# Altium footprint library Package_DIP.PcbLib: 236 footprints (part 13 of 15)
Each footprint in its own frame and in the unit in brackets; x right, y up, seen from the top. Pads: shape width x height; smd on the part's side, far side on the other; paste and mask are expansions set on the pad; w line width, h text height; cw(c..) or ccw(c..) is an arc to the next point about the centre after c.
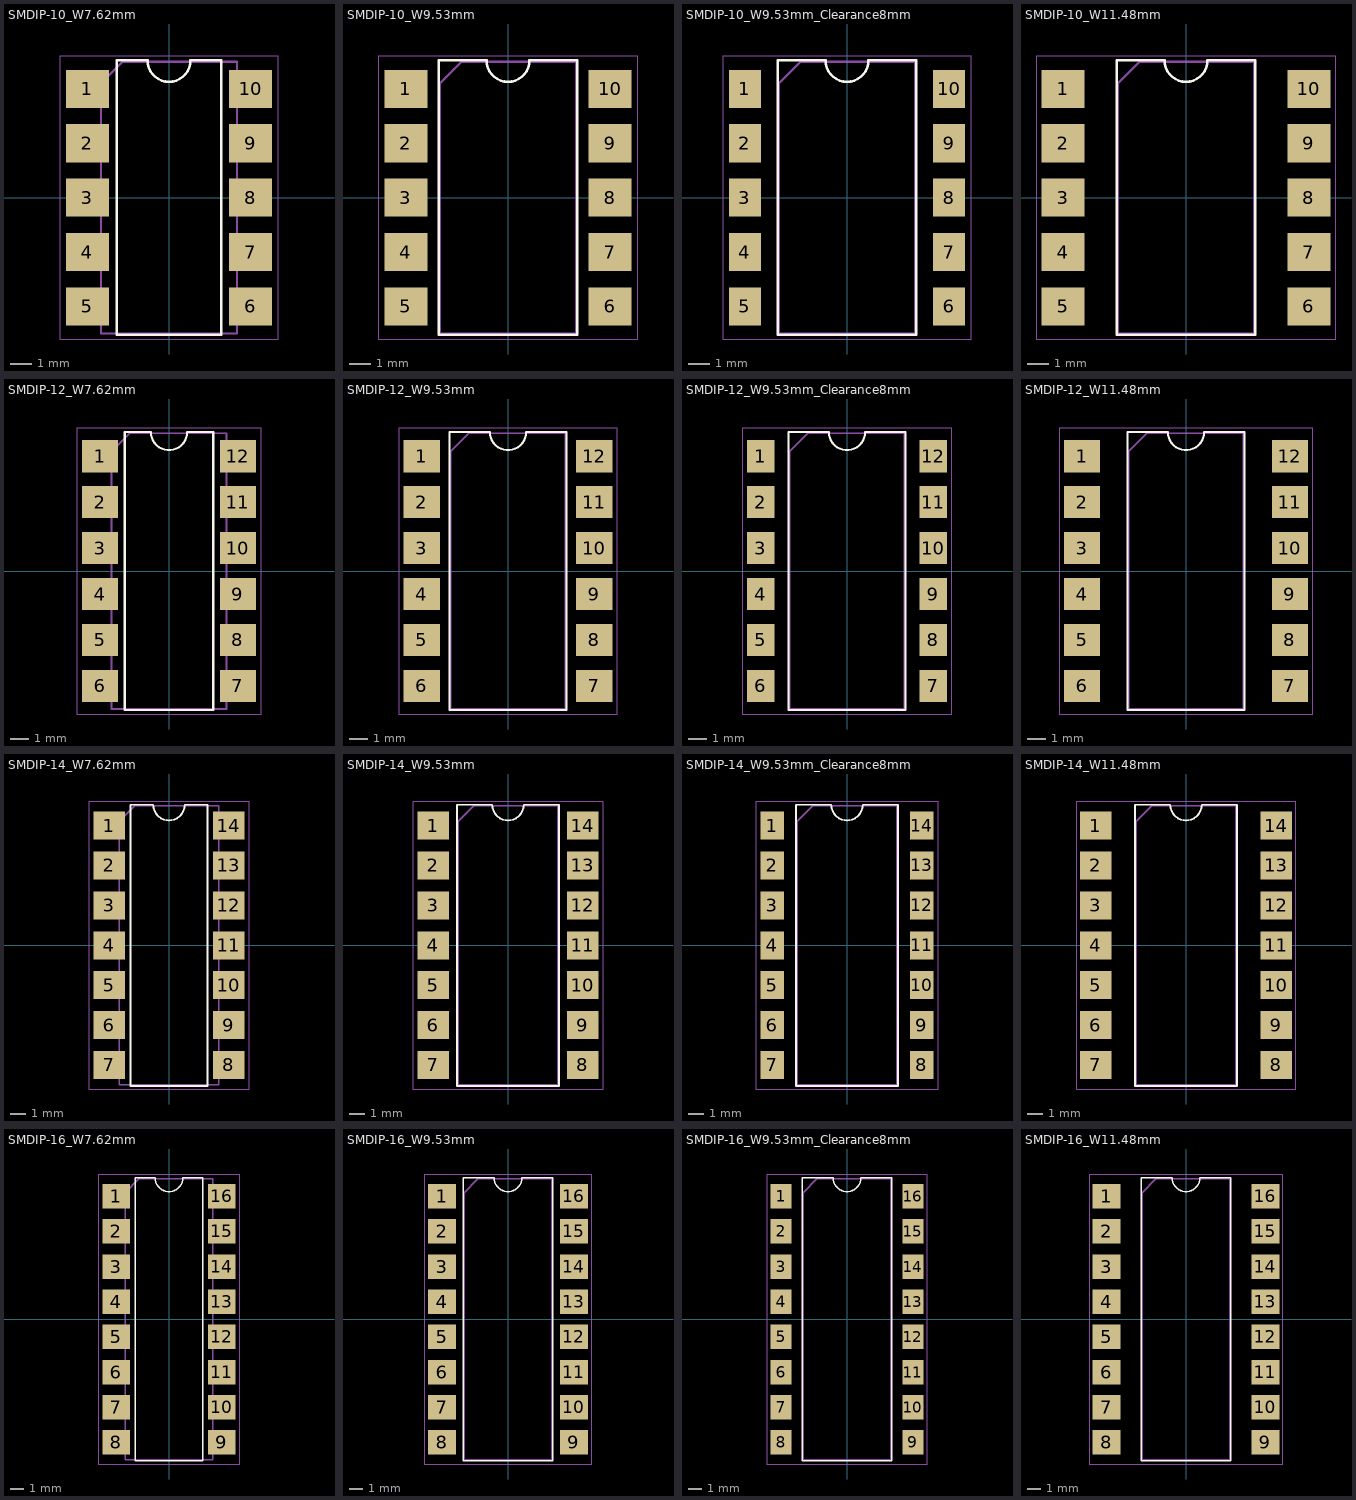
[diagram p12: the footprints below, top view; thin cyan lines are the x and y axes]

## SMDIP-10_W7.62mm [mm]
pads (10):
  rect 2x1.78 smd: 1(-3.81,5.08) 2(-3.81,2.54) 3(-3.81,0) 4(-3.81,-2.54) 5(-3.81,-5.08) 6(3.81,-5.08) 7(3.81,-2.54) 8(3.81,0) 9(3.81,2.54) 10(3.81,5.08)
F.SilkS:
  lines w0.12: -2.45,-6.41 -2.45,6.41 -1,6.41 ccw(c0,6.41) 1,6.41 2.45,6.41 2.45,-6.41 -2.45,-6.41
F.CrtYd:
  lines w0.05: -5.1,-6.6 5.1,-6.6 5.1,6.6 -5.1,6.6 -5.1,-6.6
F.Fab:
  lines w0.1: -3.175,-6.35 -3.175,5.35 -2.175,6.35 3.175,6.35 3.175,-6.35 -3.175,-6.35
  text "'.Designator'" at -4.047,-0.84 h1

## SMDIP-10_W9.53mm [mm]
pads (10):
  rect 2x1.78 smd: 1(-4.765,5.08) 2(-4.765,2.54) 3(-4.765,0) 4(-4.765,-2.54) 5(-4.765,-5.08) 6(4.765,-5.08) 7(4.765,-2.54) 8(4.765,0) 9(4.765,2.54) 10(4.765,5.08)
F.SilkS:
  lines w0.12: -3.235,-6.41 3.235,-6.41 3.235,6.41 1,6.41 cw(c0,6.41) -1,6.41 -3.235,6.41 -3.235,-6.41
F.CrtYd:
  lines w0.05: -6.05,-6.6 -6.05,6.6 6.05,6.6 6.05,-6.6 -6.05,-6.6
F.Fab:
  lines w0.1: -3.175,-6.35 -3.175,5.35 -2.175,6.35 3.175,6.35 3.175,-6.35 -3.175,-6.35
  text "'.Designator'" at -4.047,-0.84 h1

## SMDIP-10_W9.53mm_Clearance8mm [mm]
pads (10):
  rect 1.5x1.78 smd: 1(-4.765,5.08) 2(-4.765,2.54) 3(-4.765,0) 4(-4.765,-2.54) 5(-4.765,-5.08) 6(4.765,-5.08) 7(4.765,-2.54) 8(4.765,0) 9(4.765,2.54) 10(4.765,5.08)
F.SilkS:
  lines w0.12: -3.235,-6.41 3.235,-6.41 3.235,6.41 1,6.41 cw(c0,6.41) -1,6.41 -3.235,6.41 -3.235,-6.41
F.CrtYd:
  lines w0.05: -5.8,-6.6 -5.8,6.6 5.8,6.6 5.8,-6.6 -5.8,-6.6
F.Fab:
  lines w0.1: -3.175,-6.35 -3.175,5.35 -2.175,6.35 3.175,6.35 3.175,-6.35 -3.175,-6.35
  text "'.Designator'" at -4.047,-0.84 h1

## SMDIP-10_W11.48mm [mm]
pads (10):
  rect 2x1.78 smd: 1(-5.74,5.08) 2(-5.74,2.54) 3(-5.74,0) 4(-5.74,-2.54) 5(-5.74,-5.08) 6(5.74,-5.08) 7(5.74,-2.54) 8(5.74,0) 9(5.74,2.54) 10(5.74,5.08)
F.SilkS:
  lines w0.12: -3.235,-6.41 -3.235,6.41 -1,6.41 ccw(c0,6.41) 1,6.41 3.235,6.41 3.235,-6.41 -3.235,-6.41
F.CrtYd:
  lines w0.05: -7,-6.6 7,-6.6 7,6.6 -7,6.6 -7,-6.6
F.Fab:
  lines w0.1: -3.175,-6.35 -3.175,5.35 -2.175,6.35 3.175,6.35 3.175,-6.35 -3.175,-6.35
  text "'.Designator'" at -4.047,-0.84 h1

## SMDIP-12_W7.62mm [mm]
pads (12):
  rect 2x1.78 smd: 1(-3.81,6.35) 2(-3.81,3.81) 3(-3.81,1.27) 4(-3.81,-1.27) 5(-3.81,-3.81) 6(-3.81,-6.35) 7(3.81,-6.35) 8(3.81,-3.81) 9(3.81,-1.27) 10(3.81,1.27) 11(3.81,3.81) 12(3.81,6.35)
F.SilkS:
  lines w0.12: -2.45,-7.68 -2.45,7.68 -1,7.68 ccw(c0,7.68) 1,7.68 2.45,7.68 2.45,-7.68 -2.45,-7.68
F.CrtYd:
  lines w0.05: -5.1,-7.9 5.1,-7.9 5.1,7.9 -5.1,7.9 -5.1,-7.9
F.Fab:
  lines w0.1: -3.175,-7.62 3.175,-7.62 3.175,7.62 -2.175,7.62 -3.175,6.62 -3.175,-7.62
  text "'.Designator'" at -4.047,-0.84 h1

## SMDIP-12_W9.53mm [mm]
pads (12):
  rect 2x1.78 smd: 1(-4.765,6.35) 2(-4.765,3.81) 3(-4.765,1.27) 4(-4.765,-1.27) 5(-4.765,-3.81) 6(-4.765,-6.35) 7(4.765,-6.35) 8(4.765,-3.81) 9(4.765,-1.27) 10(4.765,1.27) 11(4.765,3.81) 12(4.765,6.35)
F.SilkS:
  lines w0.12: -3.235,-7.68 3.235,-7.68 3.235,7.68 1,7.68 cw(c0,7.68) -1,7.68 -3.235,7.68 -3.235,-7.68
F.CrtYd:
  lines w0.05: -6.05,-7.9 6.05,-7.9 6.05,7.9 -6.05,7.9 -6.05,-7.9
F.Fab:
  lines w0.1: -3.175,-7.62 -3.175,6.62 -2.175,7.62 3.175,7.62 3.175,-7.62 -3.175,-7.62
  text "'.Designator'" at -4.047,-0.84 h1

## SMDIP-12_W9.53mm_Clearance8mm [mm]
pads (12):
  rect 1.5x1.78 smd: 1(-4.765,6.35) 2(-4.765,3.81) 3(-4.765,1.27) 4(-4.765,-1.27) 5(-4.765,-3.81) 6(-4.765,-6.35) 7(4.765,-6.35) 8(4.765,-3.81) 9(4.765,-1.27) 10(4.765,1.27) 11(4.765,3.81) 12(4.765,6.35)
F.SilkS:
  lines w0.12: -3.235,-7.68 3.235,-7.68 3.235,7.68 1,7.68 cw(c0,7.68) -1,7.68 -3.235,7.68 -3.235,-7.68
F.CrtYd:
  lines w0.05: -5.8,-7.9 -5.8,7.9 5.8,7.9 5.8,-7.9 -5.8,-7.9
F.Fab:
  lines w0.1: -3.175,-7.62 -3.175,6.62 -2.175,7.62 3.175,7.62 3.175,-7.62 -3.175,-7.62
  text "'.Designator'" at -4.047,-0.84 h1

## SMDIP-12_W11.48mm [mm]
pads (12):
  rect 2x1.78 smd: 1(-5.74,6.35) 2(-5.74,3.81) 3(-5.74,1.27) 4(-5.74,-1.27) 5(-5.74,-3.81) 6(-5.74,-6.35) 7(5.74,-6.35) 8(5.74,-3.81) 9(5.74,-1.27) 10(5.74,1.27) 11(5.74,3.81) 12(5.74,6.35)
F.SilkS:
  lines w0.12: -3.235,-7.68 3.235,-7.68 3.235,7.68 1,7.68 cw(c0,7.68) -1,7.68 -3.235,7.68 -3.235,-7.68
F.CrtYd:
  lines w0.05: -7,-7.9 -7,7.9 7,7.9 7,-7.9 -7,-7.9
F.Fab:
  lines w0.1: -3.175,-7.62 -3.175,6.62 -2.175,7.62 3.175,7.62 3.175,-7.62 -3.175,-7.62
  text "'.Designator'" at -4.047,-0.84 h1

## SMDIP-14_W7.62mm [mm]
pads (14):
  rect 2x1.78 smd: 1(-3.81,7.62) 2(-3.81,5.08) 3(-3.81,2.54) 4(-3.81,0) 5(-3.81,-2.54) 6(-3.81,-5.08) 7(-3.81,-7.62) 8(3.81,-7.62) 9(3.81,-5.08) 10(3.81,-2.54) 11(3.81,0) 12(3.81,2.54) 13(3.81,5.08) 14(3.81,7.62)
F.SilkS:
  lines w0.12: -2.45,-8.95 2.45,-8.95 2.45,8.95 1,8.95 cw(c0,8.95) -1,8.95 -2.45,8.95 -2.45,-8.95
F.CrtYd:
  lines w0.05: -5.1,-9.15 5.1,-9.15 5.1,9.15 -5.1,9.15 -5.1,-9.15
F.Fab:
  lines w0.1: -3.175,-8.89 -3.175,7.89 -2.175,8.89 3.175,8.89 3.175,-8.89 -3.175,-8.89
  text "'.Designator'" at -4.047,-0.84 h1

## SMDIP-14_W9.53mm [mm]
pads (14):
  rect 2x1.78 smd: 1(-4.765,7.62) 2(-4.765,5.08) 3(-4.765,2.54) 4(-4.765,0) 5(-4.765,-2.54) 6(-4.765,-5.08) 7(-4.765,-7.62) 8(4.765,-7.62) 9(4.765,-5.08) 10(4.765,-2.54) 11(4.765,0) 12(4.765,2.54) 13(4.765,5.08) 14(4.765,7.62)
F.SilkS:
  lines w0.12: -3.235,-8.95 3.235,-8.95 3.235,8.95 1,8.95 cw(c0,8.95) -1,8.95 -3.235,8.95 -3.235,-8.95
F.CrtYd:
  lines w0.05: -6.05,-9.15 -6.05,9.15 6.05,9.15 6.05,-9.15 -6.05,-9.15
F.Fab:
  lines w0.1: -3.175,-8.89 -3.175,7.89 -2.175,8.89 3.175,8.89 3.175,-8.89 -3.175,-8.89
  text "'.Designator'" at -4.047,-0.84 h1

## SMDIP-14_W9.53mm_Clearance8mm [mm]
pads (14):
  rect 1.5x1.78 smd: 1(-4.765,7.62) 2(-4.765,5.08) 3(-4.765,2.54) 4(-4.765,0) 5(-4.765,-2.54) 6(-4.765,-5.08) 7(-4.765,-7.62) 8(4.765,-7.62) 9(4.765,-5.08) 10(4.765,-2.54) 11(4.765,0) 12(4.765,2.54) 13(4.765,5.08) 14(4.765,7.62)
F.SilkS:
  lines w0.12: -3.235,-8.95 -3.235,8.95 -1,8.95 ccw(c0,8.95) 1,8.95 3.235,8.95 3.235,-8.95 -3.235,-8.95
F.CrtYd:
  lines w0.05: -5.8,-9.15 -5.8,9.15 5.8,9.15 5.8,-9.15 -5.8,-9.15
F.Fab:
  lines w0.1: -3.175,-8.89 3.175,-8.89 3.175,8.89 -2.175,8.89 -3.175,7.89 -3.175,-8.89
  text "'.Designator'" at -4.047,-0.84 h1

## SMDIP-14_W11.48mm [mm]
pads (14):
  rect 2x1.78 smd: 1(-5.74,7.62) 2(-5.74,5.08) 3(-5.74,2.54) 4(-5.74,0) 5(-5.74,-2.54) 6(-5.74,-5.08) 7(-5.74,-7.62) 8(5.74,-7.62) 9(5.74,-5.08) 10(5.74,-2.54) 11(5.74,0) 12(5.74,2.54) 13(5.74,5.08) 14(5.74,7.62)
F.SilkS:
  lines w0.12: -3.235,-8.95 3.235,-8.95 3.235,8.95 1,8.95 cw(c0,8.95) -1,8.95 -3.235,8.95 -3.235,-8.95
F.CrtYd:
  lines w0.05: -7,-9.15 7,-9.15 7,9.15 -7,9.15 -7,-9.15
F.Fab:
  lines w0.1: -3.175,-8.89 3.175,-8.89 3.175,8.89 -2.175,8.89 -3.175,7.89 -3.175,-8.89
  text "'.Designator'" at -4.047,-0.84 h1

## SMDIP-16_W7.62mm [mm]
pads (16):
  rect 2x1.78 smd: 1(-3.81,8.89) 2(-3.81,6.35) 3(-3.81,3.81) 4(-3.81,1.27) 5(-3.81,-1.27) 6(-3.81,-3.81) 7(-3.81,-6.35) 8(-3.81,-8.89) 9(3.81,-8.89) 10(3.81,-6.35) 11(3.81,-3.81) 12(3.81,-1.27) 13(3.81,1.27) 14(3.81,3.81) 15(3.81,6.35) 16(3.81,8.89)
F.SilkS:
  lines w0.12: -2.45,-10.22 2.45,-10.22 2.45,10.22 1,10.22 cw(c0,10.22) -1,10.22 -2.45,10.22 -2.45,-10.22
F.CrtYd:
  lines w0.05: -5.1,-10.45 -5.1,10.45 5.1,10.45 5.1,-10.45 -5.1,-10.45
F.Fab:
  lines w0.1: -3.175,-10.16 -3.175,9.16 -2.175,10.16 3.175,10.16 3.175,-10.16 -3.175,-10.16
  text "'.Designator'" at -4.047,-0.84 h1

## SMDIP-16_W9.53mm [mm]
pads (16):
  rect 2x1.78 smd: 1(-4.765,8.89) 2(-4.765,6.35) 3(-4.765,3.81) 4(-4.765,1.27) 5(-4.765,-1.27) 6(-4.765,-3.81) 7(-4.765,-6.35) 8(-4.765,-8.89) 9(4.765,-8.89) 10(4.765,-6.35) 11(4.765,-3.81) 12(4.765,-1.27) 13(4.765,1.27) 14(4.765,3.81) 15(4.765,6.35) 16(4.765,8.89)
F.SilkS:
  lines w0.12: -3.235,-10.22 3.235,-10.22 3.235,10.22 1,10.22 cw(c0,10.22) -1,10.22 -3.235,10.22 -3.235,-10.22
F.CrtYd:
  lines w0.05: -6.05,-10.45 -6.05,10.45 6.05,10.45 6.05,-10.45 -6.05,-10.45
F.Fab:
  lines w0.1: -3.175,-10.16 -3.175,9.16 -2.175,10.16 3.175,10.16 3.175,-10.16 -3.175,-10.16
  text "'.Designator'" at -4.047,-0.84 h1

## SMDIP-16_W9.53mm_Clearance8mm [mm]
pads (16):
  rect 1.5x1.78 smd: 1(-4.765,8.89) 2(-4.765,6.35) 3(-4.765,3.81) 4(-4.765,1.27) 5(-4.765,-1.27) 6(-4.765,-3.81) 7(-4.765,-6.35) 8(-4.765,-8.89) 9(4.765,-8.89) 10(4.765,-6.35) 11(4.765,-3.81) 12(4.765,-1.27) 13(4.765,1.27) 14(4.765,3.81) 15(4.765,6.35) 16(4.765,8.89)
F.SilkS:
  lines w0.12: -3.235,-10.22 -3.235,10.22 -1,10.22 ccw(c0,10.22) 1,10.22 3.235,10.22 3.235,-10.22 -3.235,-10.22
F.CrtYd:
  lines w0.05: -5.8,-10.45 5.8,-10.45 5.8,10.45 -5.8,10.45 -5.8,-10.45
F.Fab:
  lines w0.1: -3.175,-10.16 -3.175,9.16 -2.175,10.16 3.175,10.16 3.175,-10.16 -3.175,-10.16
  text "'.Designator'" at -4.047,-0.84 h1

## SMDIP-16_W11.48mm [mm]
pads (16):
  rect 2x1.78 smd: 1(-5.74,8.89) 2(-5.74,6.35) 3(-5.74,3.81) 4(-5.74,1.27) 5(-5.74,-1.27) 6(-5.74,-3.81) 7(-5.74,-6.35) 8(-5.74,-8.89) 9(5.74,-8.89) 10(5.74,-6.35) 11(5.74,-3.81) 12(5.74,-1.27) 13(5.74,1.27) 14(5.74,3.81) 15(5.74,6.35) 16(5.74,8.89)
F.SilkS:
  lines w0.12: -3.235,-10.22 -3.235,10.22 -1,10.22 ccw(c0,10.22) 1,10.22 3.235,10.22 3.235,-10.22 -3.235,-10.22
F.CrtYd:
  lines w0.05: -7,-10.45 7,-10.45 7,10.45 -7,10.45 -7,-10.45
F.Fab:
  lines w0.1: -3.175,-10.16 3.175,-10.16 3.175,10.16 -2.175,10.16 -3.175,9.16 -3.175,-10.16
  text "'.Designator'" at -4.047,-0.84 h1